# Altium footprint library AD_Lib.PcbLib: 508 footprints (part 12 of 32)
Each footprint in its own frame and in the unit in brackets; x right, y up, seen from the top. Pads: shape width x height; smd on the part's side, far side on the other; paste and mask are expansions set on the pad; w line width, h text height; cw(c..) or ccw(c..) is an arc to the next point about the centre after c.
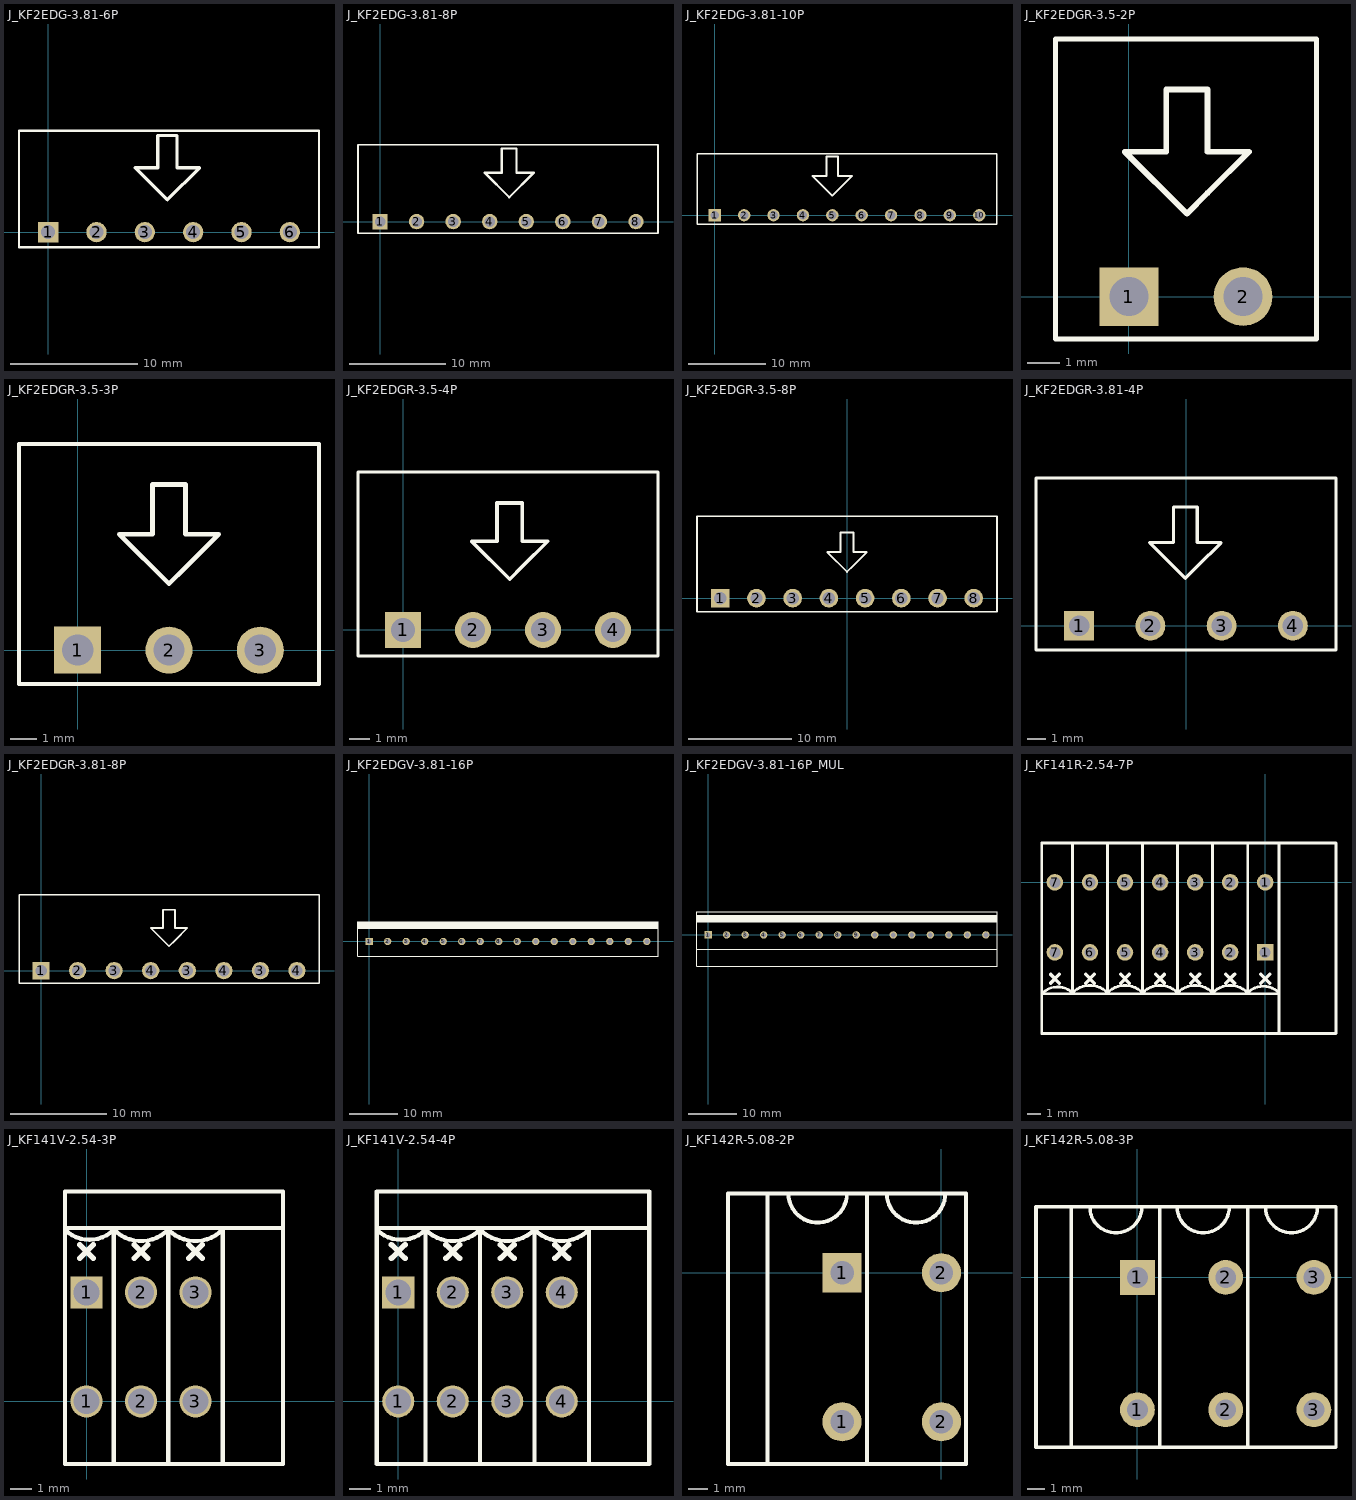
[diagram p11: the footprints below, top view; thin cyan lines are the x and y axes]

## J_KF2EDG-3.81-6P [mm] "引脚间距3.81mm，弯针。A=angle"
height 7
pads (6):
  rect 1.6x1.6 hole 1.1: 1(0,0)
  round 1.6 hole 1.1: 2(3.81,0) 3(7.62,0) 4(11.43,0) 5(15.24,0) 6(19.05,0)
Top Overlay:
  lines w0.178: 21.336,-1.2 -2.3,-1.2 -2.3,8 21.35,8 21.35,-1.2
  lines w0.254: 6.858,5.08 9.398,2.54 11.938,5.08 10.16,5.08 10.16,7.62 8.636,7.62 8.636,5.08 6.858,5.08

## J_KF2EDG-3.81-8P [mm] "引脚间距3.81mm，弯针。A=angle"
height 7
pads (8):
  rect 1.6x1.6 hole 1.1: 1(0,0)
  round 1.6 hole 1.1: 2(3.81,0) 3(7.62,0) 4(11.43,0) 5(15.24,0) 6(19.05,0) 7(22.86,0) 8(26.67,0)
Top Overlay:
  lines w0.178: 28.956,-1.2 -2.3,-1.2 -2.3,8 28.956,8 ; 28.97,-1.2 28.97,8
  lines w0.254: 10.922,5.08 13.462,2.54 16.002,5.08 14.224,5.08 14.224,7.62 12.7,7.62 12.7,5.08 10.922,5.08

## J_KF2EDG-3.81-10P [mm] "引脚间距3.81mm，弯针。A=angle"
height 7
pads (10):
  rect 1.6x1.6 hole 1.1: 1(0,0)
  round 1.6 hole 1.1: 2(3.81,0) 3(7.62,0) 4(11.43,0) 5(15.24,0) 6(19.05,0) 7(22.86,0) 8(26.67,0) 9(30.48,0) 10(34.29,0)
Top Overlay:
  lines w0.178: 36.576,-1.2 -2.3,-1.2 -2.3,8 36.576,8 ; 36.59,-1.2 36.59,8
  lines w0.254: 12.7,5.08 14.478,5.08 14.478,7.62 16.002,7.62 16.002,5.08 17.78,5.08 15.24,2.54 12.7,5.08

## J_KF2EDGR-3.5-2P [mm] "科发KF2EDGR-3.5系列凤凰端子，弯针"
height 7
pads (2):
  rect 1.8x1.8 hole 1.2: 1(0,0)
  round 1.8 hole 1.2: 2(3.5,0)
Top Overlay:
  lines w0.152: -2.25,-1.3 -2.25,7.9 5.75,7.9 5.75,-1.3 -2.25,-1.3
  lines w0.178: -0.127,4.445 1.778,2.54 2.413,3.175 3.683,4.445 2.413,4.445 2.413,6.35 1.143,6.35 1.143,4.445 -0.127,4.445

## J_KF2EDGR-3.5-3P [mm] "科发KF2EDGR-3.5系列凤凰端子，弯针"
height 7
pads (3):
  rect 1.8x1.8 hole 1.2: 1(0,0)
  round 1.8 hole 1.2: 2(3.5,0) 3(7,0)
Top Overlay:
  lines w0.152: -2.25,-1.3 -2.25,7.9 9.25,7.9 9.25,-1.3 -2.25,-1.3
  lines w0.178: 1.595,4.445 2.865,4.445 2.865,6.35 4.135,6.35 4.135,4.445 5.405,4.445 4.135,3.175 3.5,2.54 1.595,4.445

## J_KF2EDGR-3.5-4P [mm] "科发KF2EDGR-3.5系列凤凰端子，弯针"
height 7
pads (4):
  rect 1.8x1.8 hole 1.2: 1(0,0)
  round 1.8 hole 1.2: 2(3.5,0) 3(7,0) 4(10.5,0)
Top Overlay:
  lines w0.152: -2.25,-1.3 12.75,-1.3 12.75,7.9 -2.25,7.9 -2.25,-1.3
  lines w0.178: 3.429,4.445 4.699,4.445 4.699,6.35 5.969,6.35 5.969,4.445 7.239,4.445 5.969,3.175 5.334,2.54 3.429,4.445

## J_KF2EDGR-3.5-8P [mm] "科发KF2EDGR-3.5系列凤凰端子，弯针"
height 7
pads (8):
  rect 1.8x1.8 hole 1.2: 1(-12.25,0)
  round 1.8 hole 1.2: 2(-8.75,0) 3(-5.25,0) 4(-1.75,0) 5(1.75,0) 6(5.25,0) 7(8.75,0) 8(12.25,0)
Top Overlay:
  lines w0.152: -14.5,-1.3 -14.5,7.9 14.5,7.9 14.5,-1.3 -14.5,-1.3
  lines w0.178: -1.905,4.445 -0.635,4.445 -0.635,6.35 0.635,6.35 0.635,4.445 1.905,4.445 0.635,3.175 0,2.54 -1.905,4.445

## J_KF2EDGR-3.81-4P [mm] "科发KF2EDGR-3.81系列凤凰端子，弯针"
height 7
pads (4):
  rect 1.6x1.6 hole 1.1: 1(-5.715,0)
  round 1.6 hole 1.1: 2(-1.905,0) 3(1.905,0) 4(5.715,0)
Top Overlay:
  lines w0.152: -8.02,-1.3 8.02,-1.3 8.02,7.9 -8.02,7.9 -8.02,-1.3
  lines w0.178: -1.934,4.445 -0.029,2.54 0.606,3.175 1.876,4.445 0.606,4.445 0.606,6.35 -0.664,6.35 -0.664,4.445 -1.934,4.445

## J_KF2EDGR-3.81-8P [mm] "科发KF2EDGR-3.81系列凤凰端子，弯针"
height 7
pads (8):
  rect 1.8x1.8 hole 1.2: 1(0,0)
  round 1.8 hole 1.2: 2(3.81,0) 3(7.62,0) 3(15.24,0) 3(22.86,0) 4(11.43,0) 4(19.05,0) 4(26.67,0)
Top Overlay:
  lines w0.152: -2.305,-1.3 -2.305,7.9 28.975,7.9 28.975,-1.3 -2.305,-1.3
  lines w0.178: 11.43,4.445 13.335,2.54 13.97,3.175 15.24,4.445 13.97,4.445 13.97,6.35 12.7,6.35 12.7,4.445 11.43,4.445

## J_KF2EDGV-3.81-16P [mm] "引脚间距3.81mm，直针"
height 9.2
pads (16):
  rect 1.5x1.5 hole 1: 1(0,0)
  round 1.5 hole 1: 2(3.81,0) 3(7.62,0) 4(11.43,0) 5(15.24,0) 6(19.05,0) 7(22.86,0) 8(26.67,0) 9(30.48,0) 10(34.29,0) 11(38.1,0) 12(41.91,0) 13(45.72,0) 14(49.53,0) 15(53.34,0) 16(57.15,0)
Top Overlay:
  rectangle: -2.3,2.54 59.45,4
  lines w0.178: -2.3,-3 59.45,-3 59.45,4 -2.3,4 -2.3,-3

## J_KF2EDGV-3.81-16P_MUL [mm] "引脚间距3.81mm，直针。多个连接器并排，考虑母头尺寸"
height 20
pads (16):
  rect 1.5x1.5 hole 1: 1(0,0)
  round 1.5 hole 1: 2(3.81,0) 3(7.62,0) 4(11.43,0) 5(15.24,0) 6(19.05,0) 7(22.86,0) 8(26.67,0) 9(30.48,0) 10(34.29,0) 11(38.1,0) 12(41.91,0) 13(45.72,0) 14(49.53,0) 15(53.34,0) 16(57.15,0)
Top Overlay:
  rectangle: -2.3,2.54 59.45,4
  lines w0.178: -2.3,-3 59.45,-3 ; -2.3,4 59.45,4 ; -2.3,-6.5 59.45,-6.5 59.45,4.8 -2.3,4.8 -2.3,-6.5

## J_KF141R-2.54-7P [mm] "弹簧式接线端子（弯针），可拼接；引脚间距2.54mm"
height 13
pads (14):
  rect 1.2x1.2 hole 0.8 paste+0: 1(0,-5.08)
  round 1.2 hole 0.8 paste+0: 1(0,0) 2(-2.54,-5.08) 2(-2.54,0) 3(-5.08,-5.08) 3(-5.08,0) 4(-7.62,-5.08) 4(-7.62,0) 5(-10.16,-5.08) 5(-10.16,0) 6(-12.7,-5.08) 6(-12.7,0) 7(-15.24,-5.08)
  round 1.2 hole 0.8: 7(-15.24,0)
Top Overlay:
  lines w0.2: -16.19,-10.95 5.13,-10.95 ; -16.19,2.85 1,2.85 ; -6.35,-8.08 -6.35,2.794 ; 1,-8.08 -16.19,-8.08 cw(c-15.04,-9.15) -13.97,-8 cw(c-12.7,-9.27) -11.43,-8 cw(c-10.16,-9.27) -8.89,-8 cw(c-7.62,-9.27) -6.35,-8 cw(c-5.08,-9.27) -3.81,-8 cw(c-2.54,-9.27) -1.27,-8 cw(c-0.135,-9.135) 1,-8
  lines w0.203: -16.19,-10.95 -16.19,-8.08 -16.19,2.85 ; -13.97,-8.08 -13.97,2.85 ; -11.43,-8.08 -11.43,2.85 ; -8.89,-8.08 -8.89,2.85 ; -3.81,-8.08 -3.81,2.85 ; -1.27,-8.08 -1.27,2.85 ; 1,-10.95 1,2.85 5.13,2.85 5.13,-10.95
  lines w0.254: -15.557,-7.303 -14.922,-6.668 ; -15.557,-6.668 -14.922,-7.303 ; -13.017,-7.303 -12.382,-6.668 ; -13.017,-6.668 -12.382,-7.303 ; -10.477,-7.303 -9.842,-6.668 ; -10.477,-6.668 -9.842,-7.303 ; -7.937,-7.303 -7.302,-6.668 ; -7.937,-6.668 -7.302,-7.303 ; -5.397,-7.303 -4.762,-6.668 ; -5.397,-6.668 -4.762,-7.303 ; -2.857,-7.303 -2.222,-6.668 ; -2.857,-6.668 -2.222,-7.303 ; -0.317,-7.303 0.318,-6.668 ; -0.317,-6.668 0.318,-7.303

## J_KF141V-2.54-3P [mm] "弹簧式接线端子（直针），可拼接；引脚间距2.54mm"
height 13.8
pads (6):
  round 1.5 hole 1.2: 1(0,0) 2(2.54,0) 2(2.54,5.08) 3(5.08,0) 3(5.08,5.08)
  rect 1.5x1.5 hole 1.2: 1(0,5.08)
Top Overlay:
  lines w0.2: -1,8 ccw(c0.135,9.135) 1.27,8 ccw(c2.54,9.27) 3.81,8 ccw(c5.08,9.27) 6.35,8 ; 6.35,-2.92 -1,-2.92 -1,8.08 ; 6.35,8.08 6.35,-2.921 9.16,-2.921 9.16,8.08 9.16,9.78 ; 9.144,8.08 6.334,8.08 -1,8.08 ; 9.144,9.78 -1,9.78 -1,8.08
  lines w0.203: 1.27,-2.92 1.27,8.08 ; 3.81,-2.92 3.81,8.08
  lines w0.254: -0.318,6.668 0.317,7.303 ; -0.318,7.303 0.317,6.668 ; 2.222,6.668 2.857,7.303 ; 2.222,7.303 2.857,6.668 ; 4.762,6.668 5.397,7.303 ; 4.762,7.303 5.397,6.668

## J_KF141V-2.54-4P [mm] "弹簧式接线端子（直针），可拼接；引脚间距2.54mm"
height 13.8
pads (8):
  round 1.5 hole 1.2: 1(0,0) 2(2.54,0) 2(2.54,5.08) 3(5.08,0) 3(5.08,5.08) 4(7.62,0) 4(7.62,5.08)
  rect 1.5x1.5 hole 1.2: 1(0,5.08)
Top Overlay:
  lines w0.2: -1,8 ccw(c0.135,9.135) 1.27,8 ccw(c2.54,9.27) 3.81,8 ccw(c5.08,9.27) 6.35,8 ccw(c7.62,9.27) 8.89,8 ; 8.874,8.08 11.684,8.08 ; 8.89,-2.92 -1,-2.92 -1,8.08 ; -1,8.08 -1,9.78 11.7,9.78 11.7,8.08 11.7,-2.921 8.89,-2.921 8.89,8.08 -1,8.08
  lines w0.203: 1.27,-2.92 1.27,8.08 ; 3.81,-2.92 3.81,8.08 ; 6.35,-2.92 6.35,8.08
  lines w0.254: -0.318,6.668 0.317,7.303 ; -0.318,7.303 0.317,6.668 ; 2.222,6.668 2.857,7.303 ; 2.222,7.303 2.857,6.668 ; 4.762,6.668 5.397,7.303 ; 4.762,7.303 5.397,6.668 ; 7.302,6.668 7.937,7.303 ; 7.302,7.303 7.937,6.668

## J_KF142R-5.08-2P [mm] "弹簧式接线端子，可拼接；引脚间距5.08mm"
pads (4):
  round 2 hole 1.2: 1(-5.08,-7.62) 2(0,-7.62) 2(0,0)
  rect 2x2 hole 1.2: 1(-5.08,0)
Top Overlay:
  lines w0.2: -7.826,4.064 ccw(c-6.326,4.064) -4.826,4.064 ; -2.794,4.064 ccw(c-1.294,4.064) 0.206,4.064 ; -8.89,-9.779 1.27,-9.779 1.27,4.064 -8.89,4.064 -8.89,-9.779
  lines w0.203: -8.89,-9.779 -10.922,-9.779 -10.922,4.064 -8.89,4.064 ; -3.81,-9.779 -3.81,4.064

## J_KF142R-5.08-3P [mm] "弹簧式接线端子，可拼接；引脚间距5.08mm"
pads (6):
  round 2 hole 1.2: 1(0,-7.62) 2(5.08,-7.62) 2(5.08,0) 3(10.16,-7.62) 3(10.16,0)
  rect 2x2 hole 1.2: 1(0,0)
Top Overlay:
  lines w0.2: -2.746,4.064 ccw(c-1.246,4.064) 0.254,4.064 ; 2.286,4.064 ccw(c3.786,4.064) 5.286,4.064 ; 7.366,4.064 ccw(c8.866,4.064) 10.366,4.064 ; 6.35,-9.779 11.43,-9.779 11.43,4.064 6.35,4.064 ; 6.35,-9.779 6.35,4.064 ; 6.35,-9.779 -3.81,-9.779 -3.81,4.064 6.35,4.064
  lines w0.203: -3.81,-9.779 -5.842,-9.779 -5.842,4.064 -3.81,4.064 ; 1.27,-9.779 1.27,4.064